# Altium footprint library 常用元件封装库.PcbLib: 1310 footprints (part 3 of 83)
Each footprint in its own frame and in the unit in brackets; x right, y up, seen from the top. Pads: shape width x height; smd on the part's side, far side on the other; paste and mask are expansions set on the pad; w line width, h text height; cw(c..) or ccw(c..) is an arc to the next point about the centre after c.
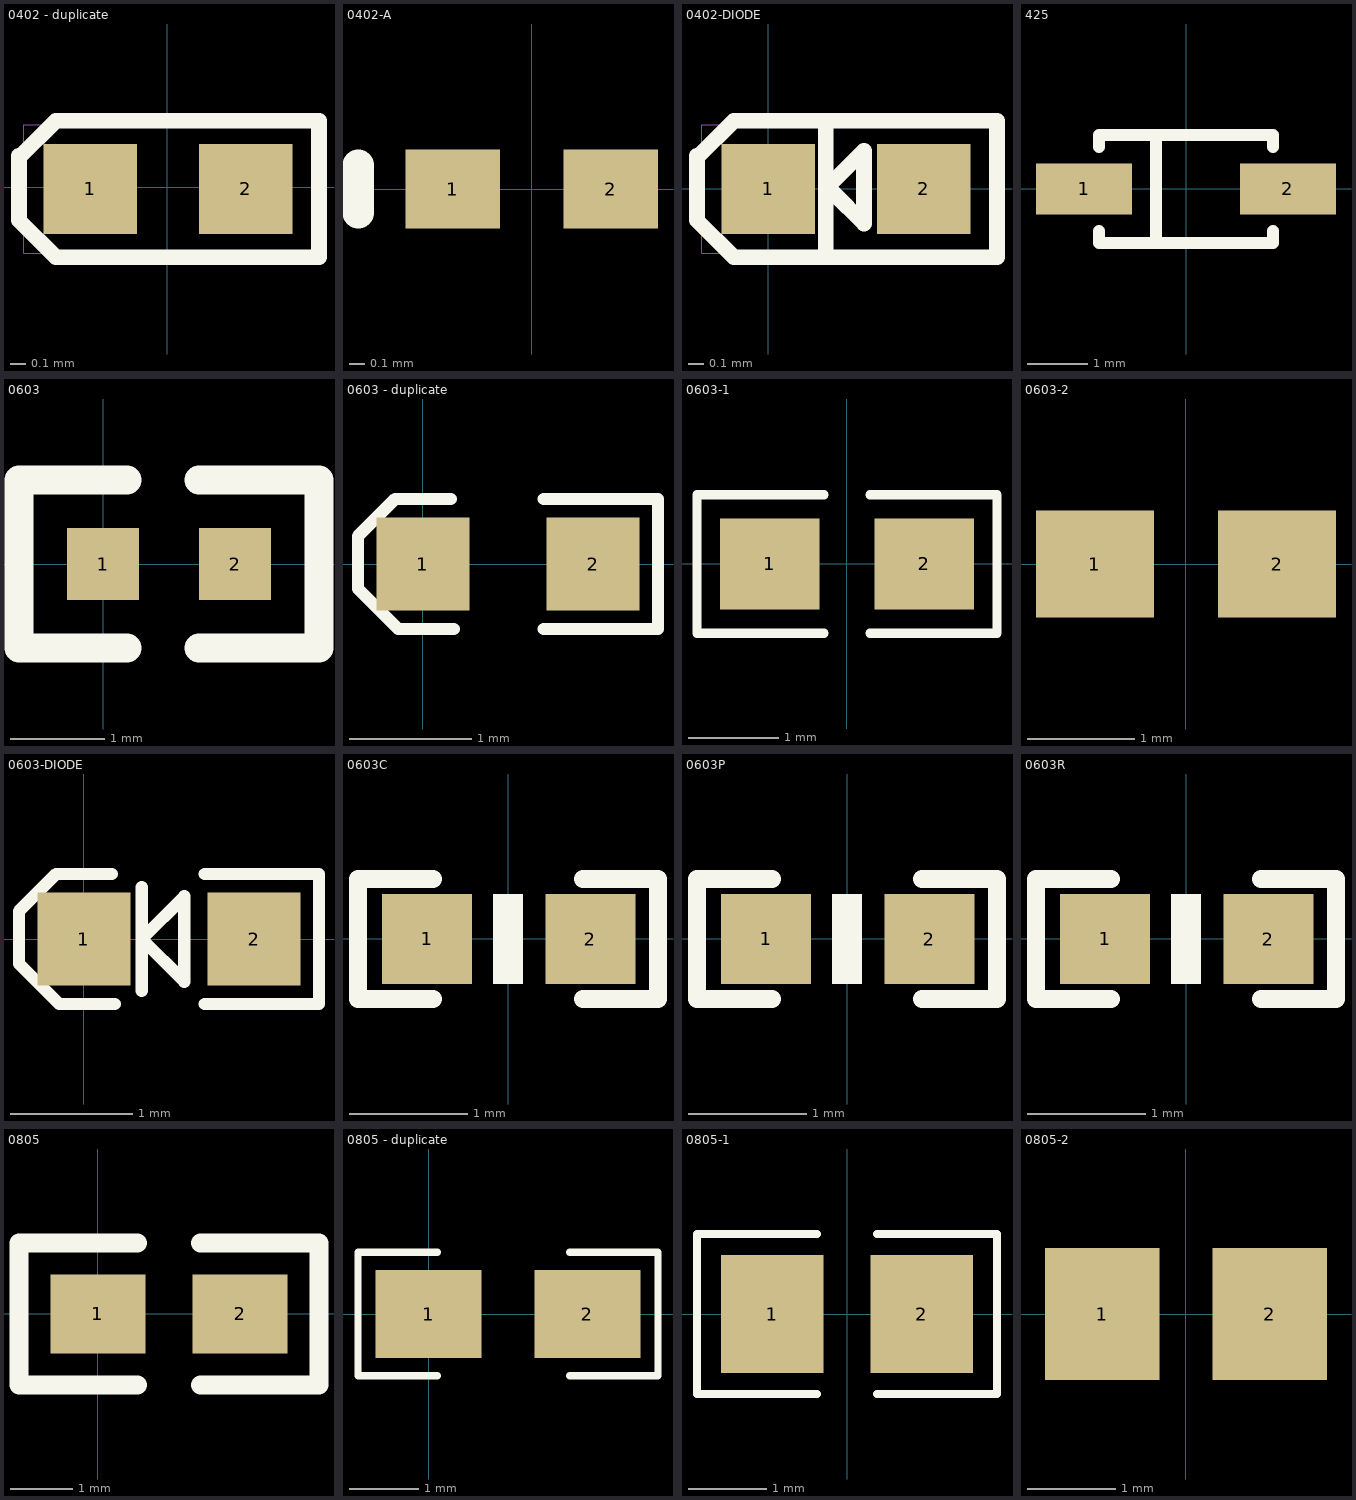
[diagram p2: the footprints below, top view; thin cyan lines are the x and y axes]

## 0402 - duplicate [mil]
pads (2):
  rect 24x23 smd: 1(-19.74,-0.49) 2(20.26,-0.49)
Top Overlay:
  lines w4: -38,-8.54 -28.54,-18 ; -38,-8 -38,8 ; -38,7.54 -28.54,17 ; -28,-18 39,-18 39,17 -28,17
Mechanical 2:
  lines w0.2: -36.74,-16.99 37.26,-16.99 37.26,16.01 -36.74,16.01 -36.74,-16.99
3D body "SW3dPS-smt_resistor_packages.STEP": height 20.24, standoff -0.24, extent -20.08,-2.76 20.08,11.81

## 0402-A [mm] "Chip Inductor; Body 1 x 0.5 mm (LxW typ)"
height 0.55
pads (2):
  rect 0.6x0.5 smd: 1(-0.5,0) 2(0.5,0)
Top Overlay:
  lines w0.2: -1.1,-0.15 -1.1,0.15

## 0402-DIODE [mil]
pads (2):
  rect 24x23 smd: 1(0,0) 2(40,0)
Top Overlay:
  lines w4: -18.26,-8.06 -8.8,-17.51 ; -18.26,-7.51 -18.26,8.49 ; -18.26,8.03 -8.8,17.49 ; -8.26,-17.51 58.74,-17.51 58.74,17.49 -8.26,17.49 ; 14.76,-17.51 14.76,17.49 ; 14.76,-0.98 16.73,-0.98 24.61,-8.86 24.61,9.84 14.76,0
Mechanical 2:
  lines w0.2: -17,-16.5 57,-16.5 57,16.5 -17,16.5 -17,-16.5

## 425 [mm] "SOD-123; 2 Leads; Body 2.7 x 1.6 mm, (LxW)"
height 1.35
pads (2):
  rect 1.6x0.85 smd: 1(-1.7,0) 2(1.7,0)
Top Overlay:
  lines w0.2: -1.45,-0.7 -1.45,-0.9 1.45,-0.9 1.45,-0.7 ; -1.45,0.7 -1.45,0.9 1.45,0.9 1.45,0.7 ; -0.5,-0.9 -0.5,0.9

## 0603 [mil]
pads (2):
  rect 30x30 smd: 1(0,0) 2(55,0)
Top Overlay:
  lines w12: 10,-35 -35,-35 -35,35 10,35 ; 40,-35 90,-35 90,35 40,35

## 0603 - duplicate [mil]
pads (2):
  rect 30x30 smd: 1(0,0) 2(55,0)
Top Overlay:
  lines w4: 9,21 -9,21 -21,9 -21,-8 -8,-21 10,-21 ; 39,-21 76,-21 76,21 39,21

## 0603-1 [mm] "贴片带丝印"
height 0.6
pads (2):
  rect 1.1x1 smd: 1(-0.85,0) 2(0.85,0)
Top Overlay:
  lines w0.1: -0.254,-0.762 -1.651,-0.762 -1.651,0.762 -0.254,0.762 ; 0.254,-0.762 1.651,-0.762 1.651,0.762 0.254,0.762
3D body: height 1, standoff 0, extent -1.143,-0.381 1.143,0.381

## 0603-2 [mm] "贴片无丝印"
height 0.6
pads (2):
  rect 1.1x1 smd: 1(-0.85,0) 2(0.85,0)

## 0603-DIODE [mil]
pads (2):
  rect 30x30 smd: 1(0,0) 2(55,0)
Top Overlay:
  lines w4: 9,21 -9,21 -21,9 -21,-8 -8,-21 10,-21 ; 18.7,-16.73 18.7,16.73 ; 39,-21 76,-21 76,21 39,21 ; 18.7,0 32.48,13.78 32.48,-13.78 18.7,0

## 0603C [mil]
pads (2):
  rect 30x30 smd: 1(-27,0) 2(27.5,-0.06)
Top Overlay:
  region: 5,-15.06 5,14.94 -5,14.94 -5,-15.06
  lines w6: -25,-20.06 -50,-20.06 -50,19.94 -25,19.94 ; 25,-20.06 50,-20.06 50,19.94 25,19.94
3D body "User Library-CapCeramic_Kemet_0603_1608.STEP": height 31.5, standoff 0, extent -28.49,-15.74 34.5,15.75

## 0603P [mil]
pads (2):
  rect 30x30 smd: 1(-27,0) 2(27.5,-0.06)
Top Overlay:
  region: 5,-15.06 5,14.94 -5,14.94 -5,-15.06
  lines w6: -25,-20.06 -50,-20.06 -50,19.94 -25,19.94 ; 25,-20.06 50,-20.06 50,19.94 25,19.94
3D body "User Library-CapCeramic_Kemet_0603_1608.STEP": height 31.5, standoff 0, extent -28.49,-15.74 34.5,15.75

## 0603R [mil]
pads (2):
  rect 30x30 smd: 1(-27,0) 2(27.5,-0.06)
Top Overlay:
  region: 5,-15.06 5,14.94 -5,14.94 -5,-15.06
  lines w6: -25,-20.06 -50,-20.06 -50,19.94 -25,19.94 ; 25,-20.06 50,-20.06 50,19.94 25,19.94
3D body "User Library-RES_1609-0603.STEP": height -16, standoff -38.05, extent -33.47,-15.75 33.47,15.75

## 0805 [mil]
pads (2):
  rect 60x50 smd: 1(0,-0.06) 2(90,-0.06)
Top Overlay:
  lines w12: 25,-45.06 -50,-45.06 -50,44.94 25,44.94 ; 65,-45.06 140,-45.06 140,44.94 65,44.94

## 0805 - duplicate [mil]
pads (2):
  rect 60x50 smd: 1(0,0) 2(90,0)
Top Overlay:
  lines w4: 5,-35 -40,-35 -40,35 5,35 ; 80,-35 130,-35 130,35 80,35

## 0805-1 [mm] "贴片带丝印"
height 1.1
pads (2):
  rect 1.3x1.5 smd: 1(-0.95,0) 2(0.95,0)
Top Overlay:
  lines w0.1: -0.381,-1.016 -1.905,-1.016 -1.905,1.016 -0.381,1.016 ; 0.381,-1.016 1.905,-1.016 1.905,1.016 0.381,1.016
3D body: height 1, standoff 0, extent -1.143,-0.508 -1.016,0.508
3D body: height 1, standoff 0, extent 1.016,-0.508 1.143,0.508
3D body: height 1, standoff 0, extent -1.016,-0.508 1.016,0.508

## 0805-2 [mm] "贴片无丝印"
height 1
pads (2):
  rect 1.3x1.5 smd: 1(-0.95,0) 2(0.95,0)